# Altium footprint library HW_HOLLAND_NCDM_MONITOR_R1.PcbLib: 472 footprints (part 26 of 30)
Each footprint in its own frame and in the unit in brackets; x right, y up, seen from the top. Pads: shape width x height; smd on the part's side, far side on the other; paste and mask are expansions set on the pad; w line width, h text height; cw(c..) or ccw(c..) is an arc to the next point about the centre after c.
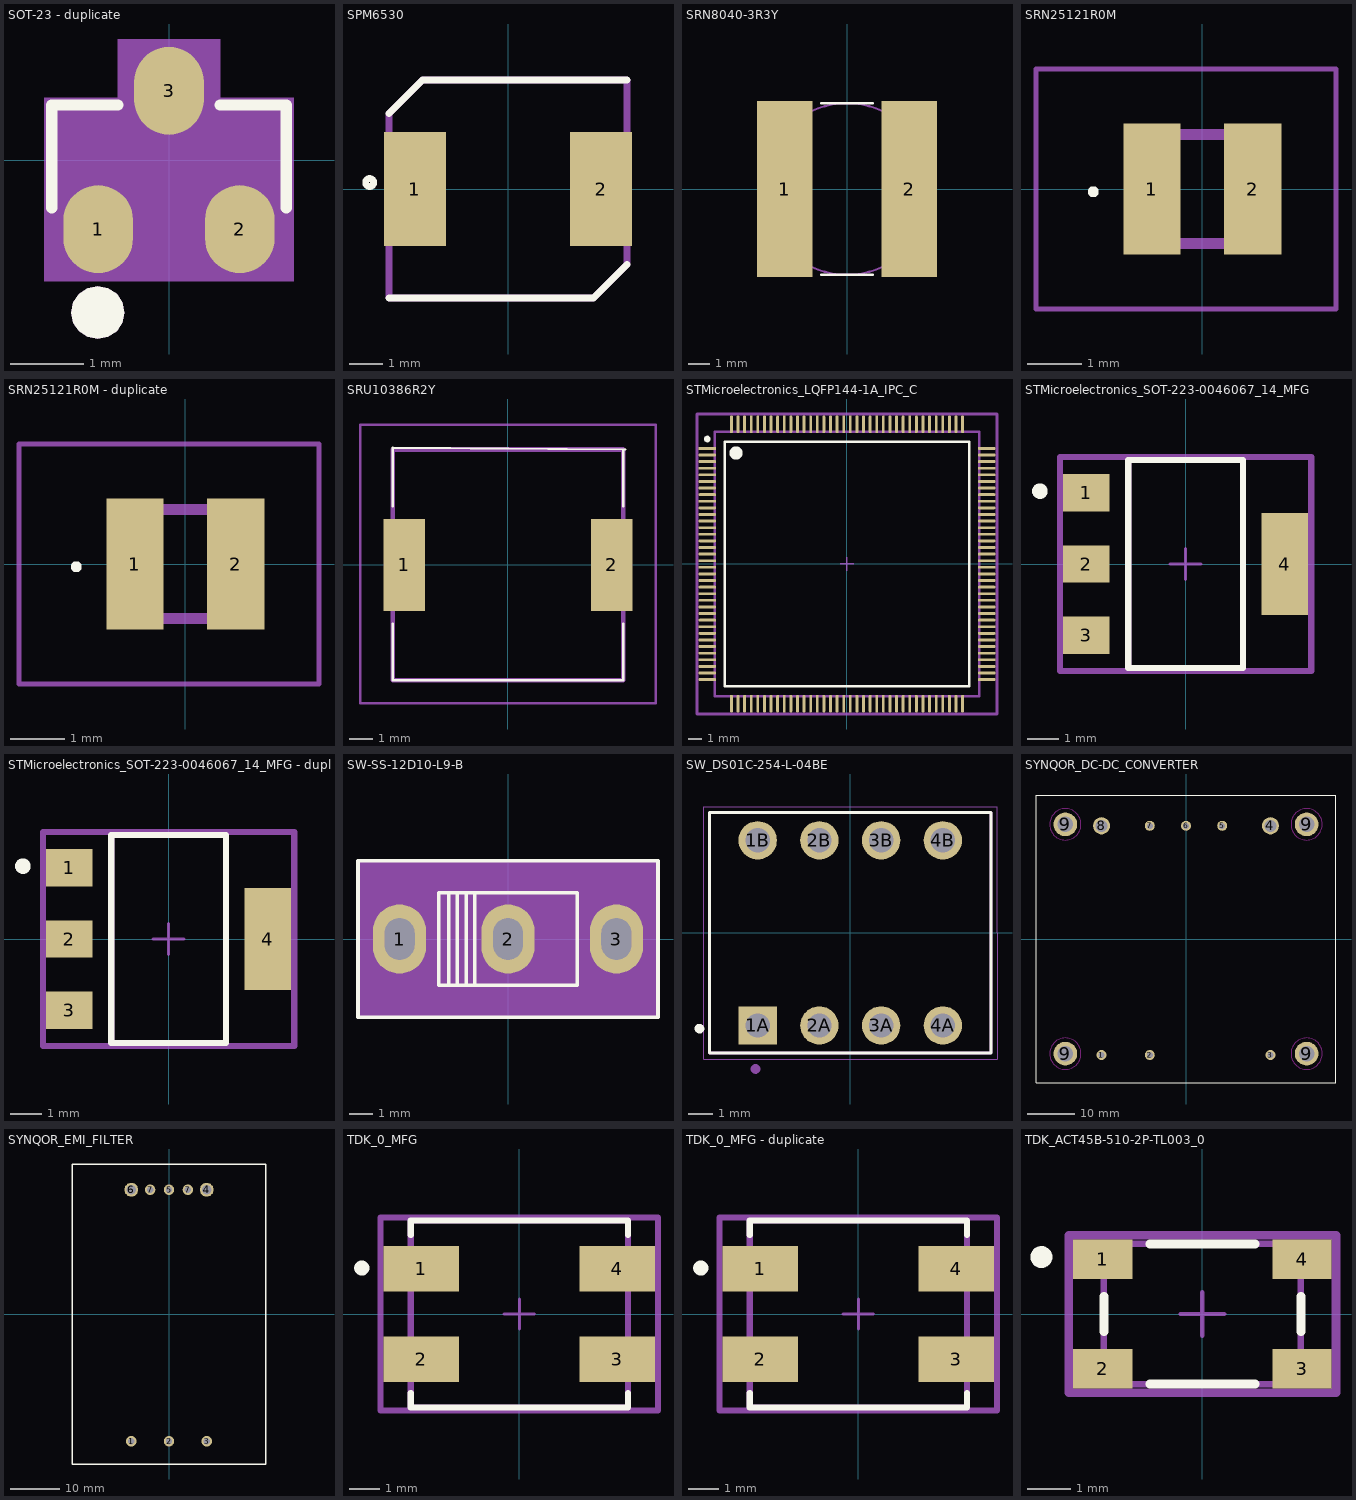
[diagram p25: the footprints below, top view; thin cyan lines are the x and y axes]

## SOT-23 - duplicate [mm] "SOT-23"
height 3.5
pads (3):
  oval 0.95x1.2 smd: 1(-0.966,-0.943) 2(0.966,-0.943) 3(0,0.943)
Top Overlay:
  dashed: -0.97,-1.719 -1.108,-1.747 -1.225,-1.825 -1.303,-1.942 -1.331,-2.08 -1.303,-2.218 -1.277,-2.257 -1.225,-2.335 -1.108,-2.413 -0.97,-2.441 -0.832,-2.413 -0.715,-2.335 -0.663,-2.257 -0.637,-2.218 -0.609,-2.08 -0.637,-1.942 -0.715,-1.825 -0.832,-1.747
  lines w0.152: -1.6,-0.65 -1.6,0.75 -0.7,0.75 ; 0.7,0.75 1.6,0.75 1.6,-0.65
  text ".Designator" at -0.597,1.021 h0.76
Top Assembly:
  dashed: -0.97,-1.719 -1.108,-1.747 -1.225,-1.825 -1.303,-1.942 -1.331,-2.08 -1.303,-2.218 -1.277,-2.257 -1.225,-2.335 -1.108,-2.413 -0.97,-2.441 -0.832,-2.413 -0.715,-2.335 -0.663,-2.257 -0.637,-2.218 -0.609,-2.08 -0.637,-1.942 -0.715,-1.825 -0.832,-1.747
  lines w0.025: -1.55,-0.65 -1.25,-0.65 -1.25,-1.325 1.25,-1.325 1.25,-0.65 1.55,-0.65 1.55,0.75 0.3,0.75 0.3,1.425 -0.3,1.425 -0.3,0.75 -1.55,0.75 -1.55,-0.65
Top 3D Body:
  region: -0.7,1.65 0.7,1.65 0.7,0.85 1.7,0.85 1.7,-1.65 -1.7,-1.65 -1.7,0.85 -0.7,0.85
Mechanical 21:
  text "1" at -0.966,-1.197 h0.64
  text "3" at 0,0.689 h0.64
  text "2" at 0.966,-1.197 h0.64
3D body "SOT23.STEP": height 1.26, standoff 0.01, extent -1.513,-1.905 1.514,1.905

## SPM6530 [mm]
pads (2):
  rect 1.85x3.4 smd: 1(-2.775,0) 2(2.775,0)
Top Overlay:
  circle w0.2: c-4.126,0.193 r0.12
  lines w0.2: -3.55,-3.25 2.55,-3.25 3.55,-2.25 ; -3.55,2.25 -2.55,3.25 3.55,3.25
Mechanical 13:
  lines w0.2: -3.55,-3.25 -3.55,2.25 -2.55,3.25 3.55,3.25 3.55,-2.25 2.55,-3.25 -3.55,-3.25
3D body "SPM6530T-3R3M.stp": height 3.15, standoff 0, extent -3.56,-3.25 3.54,3.25

## SRN8040-3R3Y [mm]
pads (2):
  rect 2.6x8.2 smd: 1(-2.9,0) 2(2.9,0)
Top Overlay:
  lines w0.1: -1.2,-4 1.2,-4 ; -1.2,4 1.2,4
Mechanical 13:
  circle w0.1: c0,0 r4
3D body "SRN8040-3R3Y.stp": height 3.95, standoff 0, extent -3.95,-4.075 3.95,4.075

## SRN25121R0M [mm]
pads (2):
  rect 1.05x2.4 smd: 1(-0.925,0) 2(0.925,0)
Top Overlay:
  lines w0.1: -2,-0.1 ccw(c-2,-0.05) -2,0 ccw(c-2,-0.05) -2,-0.1
Mechanical 13:
  lines w0.2: -1.25,-1 -1.25,1 1.25,1 1.25,-1 -1.25,-1
Mechanical 15:
  lines w0.1: -3.05,-2.2 -3.05,2.2 2.45,2.2 2.45,-2.2 -3.05,-2.2
3D body "vls252012hbx-1.step": height 1.19, standoff -0.01, extent -1.25,-1 1.25,1

## SRN25121R0M - duplicate [mm]
pads (2):
  rect 1.05x2.4 smd: 1(-0.925,0) 2(0.925,0)
Top Overlay:
  lines w0.1: -2,-0.1 ccw(c-2,-0.05) -2,0 ccw(c-2,-0.05) -2,-0.1
Mechanical 13:
  lines w0.2: -1.25,-1 -1.25,1 1.25,1 1.25,-1 -1.25,-1
Mechanical 15:
  lines w0.1: -3.05,-2.2 -3.05,2.2 2.45,2.2 2.45,-2.2 -3.05,-2.2
3D body "vls252012hbx-1.step": height 1.19, standoff -0.01, extent -1.25,-1 1.25,1

## SRU10386R2Y [mm]
pads (2):
  rect 1.8x4 smd: 1(-4.5,0) 2(4.5,0)
Top Overlay:
  lines w0.1: -5,-2.54 -5,-5 5,-5 5,-2.54 ; -5,2.54 -5,5.08 5.08,5 ; 5,2.54 5,5
Mechanical 15:
  lines w0.2: -5,-5 -5,5 5,5 5,-5 -5,-5
Mechanical 20:
  lines w0.1: -6.4,-6 -6.4,6.08 6.4,6.08 6.4,-6 -6.4,-6
3D body "SRU1038-6R2Y.stp": height 3.8, standoff 0, extent -5,-4.96 5,5.04

## STMicroelectronics_LQFP144-1A_IPC_C [mm]
pads (144):
  rect 1.355x0.212 smd paste+0 mask+0: 1(-10.575,8.75)
  rrect100% 1.355x0.212 smd paste+0 mask+0: 2(-10.575,8.25) 3(-10.575,7.75) 4(-10.575,7.25) 5(-10.575,6.75) 6(-10.575,6.25) 7(-10.575,5.75) 8(-10.575,5.25) 9(-10.575,4.75) 10(-10.575,4.25) 11(-10.575,3.75) 12(-10.575,3.25) 13(-10.575,2.75) 14(-10.575,2.25) 15(-10.575,1.75) 16(-10.575,1.25) 17(-10.575,0.75) 18(-10.575,0.25) 19(-10.575,-0.25) 20(-10.575,-0.75) 21(-10.575,-1.25) 22(-10.575,-1.75) 23(-10.575,-2.25) 24(-10.575,-2.75) 25(-10.575,-3.25) 26(-10.575,-3.75) 27(-10.575,-4.25) 28(-10.575,-4.75) 29(-10.575,-5.25) 30(-10.575,-5.75) 31(-10.575,-6.25) 32(-10.575,-6.75) 33(-10.575,-7.25) 34(-10.575,-7.75) 35(-10.575,-8.25) 36(-10.575,-8.75) 73(10.575,-8.75) 74(10.575,-8.25) 75(10.575,-7.75) 76(10.575,-7.25) 77(10.575,-6.75) 78(10.575,-6.25) 79(10.575,-5.75) 80(10.575,-5.25) 81(10.575,-4.75) 82(10.575,-4.25) 83(10.575,-3.75) 84(10.575,-3.25) 85(10.575,-2.75) 86(10.575,-2.25) 87(10.575,-1.75) 88(10.575,-1.25) 89(10.575,-0.75) 90(10.575,-0.25) 91(10.575,0.25) 92(10.575,0.75) 93(10.575,1.25) 94(10.575,1.75) 95(10.575,2.25) 96(10.575,2.75) 97(10.575,3.25) 98(10.575,3.75) 99(10.575,4.25) 100(10.575,4.75) 101(10.575,5.25) 102(10.575,5.75) 103(10.575,6.25) 104(10.575,6.75) 105(10.575,7.25) 106(10.575,7.75) 107(10.575,8.25) 108(10.575,8.75)
  rrect100% 0.212x1.355 smd paste+0 mask+0: 37(-8.75,-10.575) 38(-8.25,-10.575) 39(-7.75,-10.575) 40(-7.25,-10.575) 41(-6.75,-10.575) 42(-6.25,-10.575) 43(-5.75,-10.575) 44(-5.25,-10.575) 45(-4.75,-10.575) 46(-4.25,-10.575) 47(-3.75,-10.575) 48(-3.25,-10.575) 49(-2.75,-10.575) 50(-2.25,-10.575) 51(-1.75,-10.575) 52(-1.25,-10.575) 53(-0.75,-10.575) 54(-0.25,-10.575) 55(0.25,-10.575) 56(0.75,-10.575) 57(1.25,-10.575) 58(1.75,-10.575) 59(2.25,-10.575) 60(2.75,-10.575) 61(3.25,-10.575) 62(3.75,-10.575) 63(4.25,-10.575) 64(4.75,-10.575) 65(5.25,-10.575) 66(5.75,-10.575) 67(6.25,-10.575) 68(6.75,-10.575) 69(7.25,-10.575) 70(7.75,-10.575) 71(8.25,-10.575) 72(8.75,-10.575) 109(8.75,10.575) 110(8.25,10.575) 111(7.75,10.575) 112(7.25,10.575) 113(6.75,10.575) 114(6.25,10.575) 115(5.75,10.575) 116(5.25,10.575) 117(4.75,10.575) 118(4.25,10.575) 119(3.75,10.575) 120(3.25,10.575) 121(2.75,10.575) 122(2.25,10.575) 123(1.75,10.575) 124(1.25,10.575) 125(0.75,10.575) 126(0.25,10.575) 127(-0.25,10.575) 128(-0.75,10.575) 129(-1.25,10.575) 130(-1.75,10.575) 131(-2.25,10.575) 132(-2.75,10.575) 133(-3.25,10.575) 134(-3.75,10.575) 135(-4.25,10.575) 136(-4.75,10.575) 137(-5.25,10.575) 138(-5.75,10.575) 139(-6.25,10.575) 140(-6.75,10.575) 141(-7.25,10.575) 142(-7.75,10.575) 143(-8.25,10.575) 144(-8.75,10.575)
Top Overlay:
  circle w0.5: c-8.4,8.4 r0.25
  circle w0.25: c-10.575,9.46 r0.125
  lines w0.2: -9.25,-9.25 -9.25,9.25 9.25,9.25 9.25,-9.25 -9.25,-9.25
Top Courtyard:
  lines w0.2: -11.353,-11.353 -11.353,11.353 11.353,11.353 11.353,-11.353 -11.353,-11.353
  text ".Designator" at 0,0.046 h1.25
Mechanical 12:
  lines w0.2: -10,-10 -10,10 10,10 10,-10 -10,-10
Mechanical 15:
  lines w0.1: -0.5,0 0.5,0 ; 0,-0.5 0,0.5
  lines w0.2: -11.353,-11.353 -11.353,11.353 11.353,11.353 11.353,-11.353 -11.353,-11.353
3D body "IC_STMicroelectronics_STM32H723ZGT6_eec.STEP": height 1.6, standoff 0, extent -11.01,-11.01 11.01,11.01

## STMicroelectronics_SOT-223-0046067_14_MFG [mm]
pads (4):
  rect 1.5x1.2 smd paste+0 mask+0: 1(-3.2,2.3) 2(-3.2,0) 3(-3.2,-2.3)
  rect 1.5x3.3 smd paste+0 mask+0: 4(3.2,0)
Top Overlay:
  circle w0.25: c-4.7,2.35 r0.125
  lines w0.2: -1.85,-3.35 1.85,-3.35 1.85,3.35 -1.85,3.35 -1.85,-3.35
Top Courtyard:
  lines w0.2: -4.05,-3.45 4.05,-3.45 4.05,3.45 -4.05,3.45 -4.05,-3.45
  text ".Designator" at 0,0.188 h1
Mechanical 12:
  lines w0.2: -1.85,-3.35 1.85,-3.35 1.85,3.35 -1.85,3.35 -1.85,-3.35
Mechanical 15:
  lines w0.1: -0.5,0 0.5,0 ; 0,-0.5 0,0.5
  lines w0.2: -4.05,-3.45 4.05,-3.45 4.05,3.45 -4.05,3.45 -4.05,-3.45
3D body "IC_STMicroelectronics_LD1117S33CTR_eec.STEP": height 0.25, standoff 0, extent -4.05,-3.45 4.05,3.45

## STMicroelectronics_SOT-223-0046067_14_MFG - duplicate [mm]
pads (4):
  rect 1.5x1.2 smd paste+0 mask+0: 1(-3.2,2.3) 2(-3.2,0) 3(-3.2,-2.3)
  rect 1.5x3.3 smd paste+0 mask+0: 4(3.2,0)
Top Overlay:
  circle w0.25: c-4.7,2.35 r0.125
  lines w0.2: -1.85,-3.35 -1.85,3.35 1.85,3.35 1.85,-3.35 -1.85,-3.35
Top Courtyard:
  lines w0.2: -4.05,-3.45 -4.05,3.45 4.05,3.45 4.05,-3.45 -4.05,-3.45
  text ".Designator" at 0,0.188 h1
Mechanical 12:
  lines w0.2: -1.85,-3.35 -1.85,3.35 1.85,3.35 1.85,-3.35 -1.85,-3.35
Mechanical 15:
  lines w0.1: -0.5,0 0.5,0 ; 0,-0.5 0,0.5
  lines w0.2: -4.05,-3.45 -4.05,3.45 4.05,3.45 4.05,-3.45 -4.05,-3.45
3D body "IC_STMicroelectronics_LD1117S33CTR_eec.STEP": height 0.25, standoff 0, extent -4.05,-3.45 4.05,3.45

## SW-SS-12D10-L9-B [mm]
pads (3):
  oval 2.3x3 hole 1.3 slot 1.8 at 90 deg: 1(-4.7,0) 2(0,0) 3(4.7,0)
Top Overlay:
  lines w0.152: -2.572,-2.002 -2.572,2.002 ; -2.202,-2.002 -2.202,2.002 ; -1.811,-2.002 -1.811,2.002 ; -1.431,-2.002 -1.431,2.002 ; -6.5,-3.4 -6.5,3.4 6.5,3.4 6.5,-3.4 -6.5,-3.4 ; -3,-2 -3,2 3,2 3,-2 -3,-2
  text ".Designator" at -0.953,-0.212 h0.64
Top Assembly:
  lines w0.025: -6.5,-3.4 -6.5,3.4 6.5,3.4 6.5,-3.4 -6.5,-3.4 ; -3,-2 -3,2 3,2 3,-2 -3,-2
Top 3D Body:
  region: -6.5,3.4 -6.5,-3.4 6.5,-3.4 6.5,3.4
Mechanical 17:
  text "2" at 0.2,0.166 h0.46
  text "3" at 4.89,0.196 h0.46
  text "1" at -4.5,0.166 h0.46
3D body: height 3.81, standoff 0, extent -6.5,-3.4 6.5,3.4

## SW_DS01C-254-L-04BE [mm]
height 0.52
pads (8):
  rect 1.58x1.58 hole 1: 1A(-3.81,-3.81)
  round 1.58 hole 1: 1B(-3.81,3.81) 2A(-1.27,-3.81) 2B(-1.27,3.81) 3A(1.27,-3.81) 3B(1.27,3.81) 4A(3.81,-3.81) 4B(3.81,3.81)
Top Overlay:
  circle w0.2: c-6.209,-3.939 r0.1
  lines w0.127: -5.79,-4.95 5.79,-4.95 5.79,4.95 -5.79,4.95 -5.79,-4.95
Mechanical 13:
  circle w0.2: c-3.9,-5.6 r0.1
  lines w0.127: -5.79,-4.95 5.79,-4.95 5.79,4.95 -5.79,4.95 -5.79,-4.95
Mechanical 15:
  lines w0.05: -6.04,-5.2 6.04,-5.2 6.04,5.2 -6.04,5.2 -6.04,-5.2
3D body "CUI_DEVICES_DS01C-254-L-04BE.step": height 6.62, standoff -3.73, extent -5.812,-4.95 5.768,4.95

## SYNQOR_DC-DC_CONVERTER [mm]
pads (12):
  round 2.1 hole 1.27: 1(-17.8,-24.43) 2(-7.62,-24.43) 3(17.78,-24.43) 5(7.62,23.83) 6(0,23.83) 7(-7.62,23.83)
  round 3.6 hole 2.53: 4(17.78,23.83) 8(-17.78,23.83)
  round 5 hole 3.3 unplated: 9(-25.4,-24.13) 9(-25.4,24.13) 9(25.4,-24.13) 9(25.4,24.13)
Top Overlay:
  lines w0.254: -31.57,-30.3 -31.57,30.3 31.57,30.3 31.57,-30.3 -31.57,-30.3
Keep-Out Layer:
  lines w0.254: -22.103,-23.986 cw(c-25.4,-24.13) -22.103,-23.983 ; -22.103,24.274 cw(c-25.4,24.13) -22.103,24.277 ; 28.697,-23.986 cw(c25.4,-24.13) 28.697,-23.983 ; 28.697,24.274 cw(c25.4,24.13) 28.697,24.277
3D body "RQ18050HPC36NRS-G.stp": height 13, standoff -4.14, extent -31.522,-30.325 31.622,30.279

## SYNQOR_EMI_FILTER [mm]
pads (8):
  round 2.1 hole 1.27: 1(-7.62,-25.7) 2(0,-25.7) 3(7.62,-25.7) 5(0,25.1) 7(-3.81,25.1) 7(3.81,25.1)
  round 2.8 hole 1.975: 4(7.62,25.1) 6(-7.62,25.1)
Top Overlay:
  lines w0.254: -19.505,-30.3 19.505,-30.3 19.505,30.3 0,30.3 -19.505,30.3 -19.505,-30.3
3D body "RQ200PFQTC10SRS-G.stp": height 13.46, standoff -4.14, extent -19.308,-30.192 19.707,30.413

## TDK_0_MFG [mm]
pads (4):
  rect 2.5x1.5 smd paste+0 mask+0: 1(-3.25,1.5) 2(-3.25,-1.5) 3(3.25,-1.5) 4(3.25,1.5)
Top Overlay:
  circle w0.25: c-5.225,1.525 r0.125
  lines w0.2: -3.6,-2.625 -3.6,-3.1 3.6,-3.1 3.6,-2.625 ; -3.6,2.625 -3.6,3.1 3.6,3.1 3.6,2.625
Top Courtyard:
  lines w0.2: -4.6,-3.2 -4.6,3.2 4.6,3.2 4.6,-3.2 -4.6,-3.2
  text ".Designator" at 0,0.188 h1
Mechanical 12:
  lines w0.2: -3.6,-3.1 -3.6,3.1 3.6,3.1 3.6,-3.1 -3.6,-3.1
Mechanical 15:
  lines w0.1: -0.5,0 0.5,0 ; 0,-0.5 0,0.5
  lines w0.2: -4.6,-3.2 -4.6,3.2 4.6,3.2 4.6,-3.2 -4.6,-3.2
3D body "Filter_TDK_ACM7060-701-2PL-TL01_eec.STEP": height 3.5, standoff 0, extent -3.5,-3 3.5,3

## TDK_0_MFG - duplicate [mm]
pads (4):
  rect 2.5x1.5 smd paste+0 mask+0: 1(-3.25,1.5) 2(-3.25,-1.5) 3(3.25,-1.5) 4(3.25,1.5)
Top Overlay:
  circle w0.25: c-5.225,1.525 r0.125
  lines w0.2: -3.6,-2.625 -3.6,-3.1 3.6,-3.1 3.6,-2.625 ; -3.6,2.625 -3.6,3.1 3.6,3.1 3.6,2.625
Top Courtyard:
  lines w0.2: -4.6,-3.2 4.6,-3.2 4.6,3.2 -4.6,3.2 -4.6,-3.2
  text ".Designator" at 0,0.188 h1
Mechanical 12:
  lines w0.2: -3.6,-3.1 3.6,-3.1 3.6,3.1 -3.6,3.1 -3.6,-3.1
Mechanical 15:
  lines w0.1: -0.5,0 0.5,0 ; 0,-0.5 0,0.5
  lines w0.2: -4.6,-3.2 4.6,-3.2 4.6,3.2 -4.6,3.2 -4.6,-3.2
3D body "Filter_TDK_ACM7060-701-2PL-TL01_eec.STEP": height 3.5, standoff 0, extent -3.5,-3 3.5,3

## TDK_ACT45B-510-2P-TL003_0 [mm]
pads (4):
  rect 1.35x0.9 smd paste+0 mask+0: 1(-2.275,1.25) 2(-2.275,-1.25) 3(2.275,-1.25) 4(2.275,1.25)
Top Overlay:
  circle w0.25: c-3.675,1.3 r0.125
  lines w0.2: -2.25,-0.4 -2.25,0.4 ; -1.2,-1.6 1.2,-1.6 ; -1.2,1.6 1.2,1.6 ; 2.25,-0.4 2.25,0.4
Top Courtyard:
  lines w0.2: -3.05,-1.8 3.05,-1.8 3.05,1.8 -3.05,1.8 -3.05,-1.8
  text ".Designator" at 0,0 h1
Mechanical 12:
  lines w0.15: -2.25,-1.6 2.25,-1.6 2.25,1.6 -2.25,1.6 -2.25,-1.6
Mechanical 15:
  lines w0.1: -0.5,0 0.5,0 ; 0,-0.5 0,0.5
  lines w0.2: -3.05,-1.8 3.05,-1.8 3.05,1.8 -3.05,1.8 -3.05,-1.8
3D body "act45b.step": height 2.83, standoff 0.03, extent -2.223,-1.549 2.277,1.651